# Altium footprint library Misc.PcbLib: 110 footprints (part 5 of 7)
Each footprint in its own frame and in the unit in brackets; x right, y up, seen from the top. Pads: shape width x height; smd on the part's side, far side on the other; paste and mask are expansions set on the pad; w line width, h text height; cw(c..) or ccw(c..) is an arc to the next point about the centre after c.
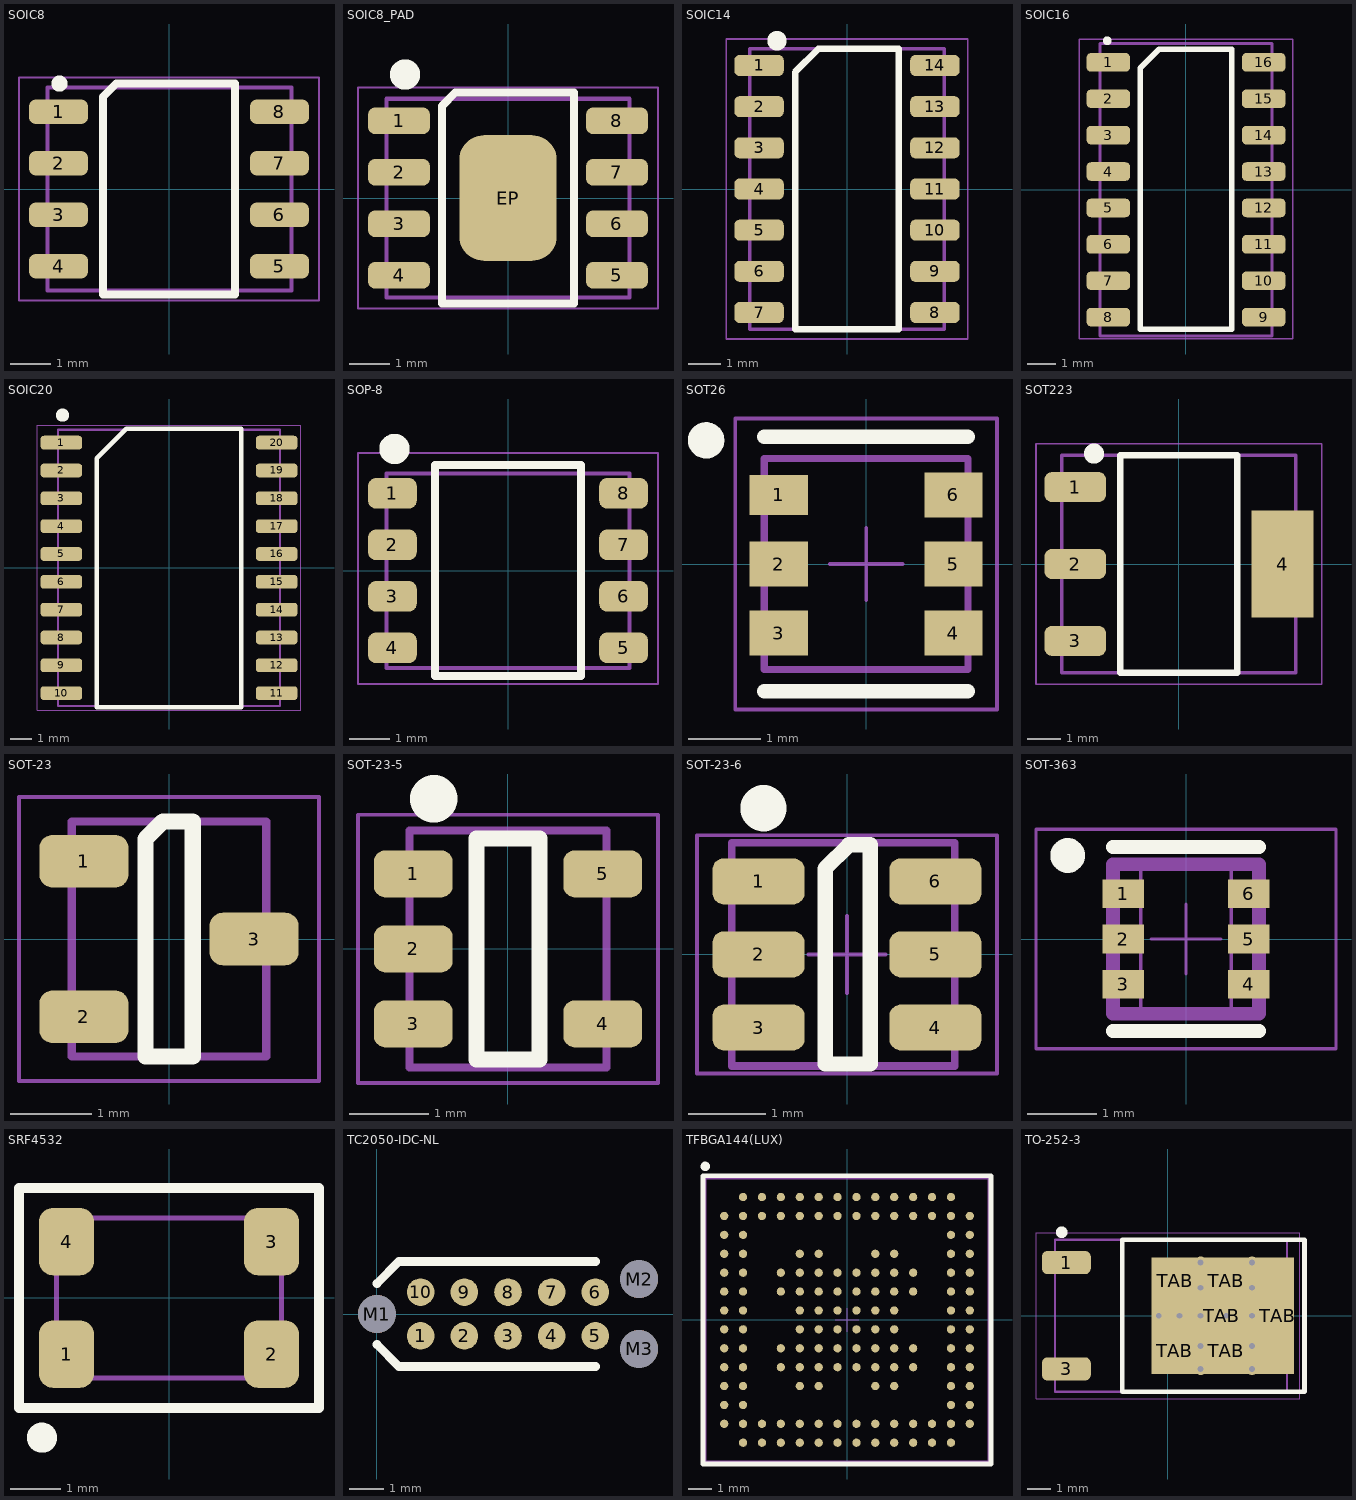
[diagram p4: the footprints below, top view; thin cyan lines are the x and y axes]

## SOIC8 [mm] "8-SOIC (0.154\", 3.90mm Width)"
height 1.75
pads (8):
  rrect50% 1.45x0.6 smd: 1(-2.725,1.905) 2(-2.725,0.635) 3(-2.725,-0.635) 4(-2.725,-1.905) 5(2.725,-1.905) 6(2.725,-0.635) 7(2.725,0.635) 8(2.725,1.905)
Top Overlay:
  circle w0.2: c-2.7,2.6 r0.1
  lines w0.2: -1.625,-2.6 1.625,-2.6 1.625,2.6 -1.3,2.6 -1.625,2.275 -1.625,-2.6
Mechanical 13:
  lines w0.1: -3,-2.5 -3,2.5 3.025,2.5 3.025,-2.5 -3,-2.5
Mechanical 15:
  lines w0.05: -3.7,-2.75 -3.7,2.75 3.7,2.75 3.7,-2.75 -3.7,-2.75
3D body "S08.stp": height 1.55, standoff 0, extent -2.975,-2.45 3.025,2.45

## SOIC8_PAD [mm] "8-SOIC with exposed pad (0.154\", 3.90mm Width)"
height 1.75
pads (9):
  rrect50% 1.525x0.65 smd: 1(-2.688,1.905) 2(-2.688,0.635) 3(-2.688,-0.635) 4(-2.688,-1.905) 5(2.688,-1.905) 6(2.688,-0.635) 7(2.688,0.635) 8(2.688,1.905)
  rrect50% 2.4x3.1 smd: EP(0,0)
Top Overlay:
  circle w0.5: c-2.54,3.048 r0.125
  lines w0.2: -1.625,-2.6 -1.625,2.275 -1.3,2.6 1.625,2.6 1.625,-2.6 -1.625,-2.6
Mechanical 13:
  lines w0.1: -3,-2.45 -3,2.45 3,2.45 3,-2.45 -3,-2.45
Mechanical 15:
  lines w0.05: -3.7,-2.725 -3.7,2.725 3.7,2.725 3.7,-2.725 -3.7,-2.725
3D body "AP64352QSP-13.stp": height 1.63, standoff 0, extent -3,-2.45 3,2.45

## SOIC14 [mm] "14 -SOIC (0.154\", 3.90mm Width)"
height 1.75
pads (14):
  rrect50% 1.525x0.65 smd: 1(-2.712,3.81) 2(-2.712,2.54) 3(-2.712,1.27) 4(-2.712,0) 5(-2.712,-1.27) 6(-2.712,-2.54) 7(-2.712,-3.81) 8(2.712,-3.81) 9(2.712,-2.54) 10(2.712,-1.27) 11(2.712,0) 12(2.712,1.27) 13(2.712,2.54) 14(2.712,3.81)
Top Overlay:
  circle w0.5: c-2.159,4.572 r0.05
  lines w0.2: -1.6,-4.325 1.6,-4.325 1.6,4.325 -0.508,4.325 -0.882,4.325 -1.6,3.607 -1.6,-4.325
Mechanical 13:
  lines w0.1: -3,-4.325 -3,4.325 3,4.325 3,-4.325 -3,-4.325
Mechanical 15:
  lines w0.05: -3.725,-4.625 -3.725,4.625 3.725,4.625 3.725,-4.625 -3.725,-4.625
3D body "LMV324ID.stp": height 1.75, standoff 0, extent -3,-4.325 3,4.325

## SOIC16 [mm] "16-SOIC (0.154\", 3.90mm Width)"
height 1.75
pads (16):
  rrect50% 1.525x0.65 smd: 1(-2.712,4.445) 2(-2.712,3.175) 3(-2.712,1.905) 4(-2.712,0.635) 5(-2.712,-0.635) 6(-2.712,-1.905) 7(-2.712,-3.175) 8(-2.712,-4.445) 9(2.712,-4.445) 10(2.712,-3.175) 11(2.712,-1.905) 12(2.712,-0.635) 13(2.712,0.635) 14(2.712,1.905) 15(2.712,3.175) 16(2.712,4.445)
Top Overlay:
  circle w0.2: c-2.75,5.2 r0.05
  lines w0.2: -1.6,-4.865 1.6,-4.865 1.6,4.9 -0.942,4.9 -1.6,4.242 -1.6,-4.865
Mechanical 13:
  lines w0.1: -3,-5.1 -3,5.1 3,5.1 3,-5.1 -3,-5.1
Mechanical 15:
  lines w0.05: -3.725,-5.2 -3.725,5.26 3.725,5.26 3.725,-5.2 -3.725,-5.2
3D body "User Library-so16.step": height 1.7, standoff 0, extent -3,-5.1 3,5.1

## SOIC20 [mm] "20-SOIC (0.295\", 7.50mm Width)"
height 2.65
pads (20):
  rrect50% 1.9x0.63 smd: 1(-4.91,5.715) 2(-4.91,4.445) 3(-4.91,3.175) 4(-4.91,1.905) 5(-4.91,0.635) 6(-4.91,-0.635) 7(-4.91,-1.905) 8(-4.91,-3.175) 9(-4.91,-4.445) 10(-4.91,-5.715) 11(4.91,-5.715) 12(4.91,-4.445) 13(4.91,-3.175) 14(4.91,-1.905) 15(4.91,-0.635) 16(4.91,0.635) 17(4.91,1.905) 18(4.91,3.175) 19(4.91,4.445) 20(4.91,5.715)
Top Overlay:
  circle w0.5: c-4.859,6.972 r0.05
  lines w0.2: -3.3,-6.35 3.3,-6.35 3.3,6.35 -1.95,6.35 -3.3,5 -3.3,-6.35
Mechanical 13:
  lines w0.1: -5.067,-6.3 -5.067,6.3 5.067,6.3 5.067,-6.3 -5.067,-6.3
Mechanical 15:
  lines w0.05: -6,-6.5 6,-6.5 6,6.5 -6,6.5 -6,-6.5
3D body "User Library-SOIC20.step": height 2.3, standoff 0.06, extent -5.067,-6.3 5.067,6.3

## SOP-8 [mm] "Surface Mount 8-SOP"
height 1.75
pads (8):
  rrect50% 1.2x0.75 smd: 1(-2.85,1.905) 2(-2.85,0.635) 3(-2.85,-0.635) 4(-2.85,-1.905) 5(2.85,-1.905) 6(2.85,-0.635) 7(2.85,0.635) 8(2.85,1.905)
Top Overlay:
  circle w0.5: c-2.8,3 r0.125
  lines w0.2: -1.8,-2.6 -1.8,2.6 1.8,2.6 1.8,-2.6 -1.8,-2.6
Mechanical 13:
  lines w0.1: -3,-2.4 -3,2.4 3,2.4 3,-2.4 -3,-2.4
Mechanical 15:
  lines w0.05: -3.7,-2.8 -3.7,2.9 3.7,2.9 3.7,-2.8 -3.7,-2.8
3D body "User Library-FairchildSemi 8-SOP.step": height 1.7, standoff 0, extent -2.997,-2.418 2.997,2.408

## SOT26 [mm] "SOT-26 - 6pin, 3x3.1mm"
height 1.1
pads (6):
  rect 0.8x0.55 smd paste+0 mask+0: 1(-1.2,0.95)
  rect 0.8x0.616 smd paste+0 mask+0: 2(-1.2,0) 3(-1.2,-0.95) 4(1.2,-0.95) 5(1.2,0) 6(1.2,0.95)
Top Overlay:
  circle w0.25: c-2.2,1.7 r0.125
  lines w0.2: -1.4,-1.75 1.4,-1.75 ; -1.4,1.75 1.4,1.75
Mechanical 13:
  lines w0.1: -1.4,-1.45 1.4,-1.45 1.4,1.45 -1.4,1.45 -1.4,-1.45
Mechanical 15:
  lines w0.05: -0.5,0 0.5,0 ; 0,-0.5 0,0.5 ; -1.8,-2 -1.8,2 1.8,2 1.8,-2 -1.8,-2
3D body "Diode_Diodes_Inc_D5V0P4UR6SO-7_eec.STEP": height 1.4, standoff 0, extent -1.4,-1.45 1.4,1.45

## SOT223 [mm] "Plastic surface-mounted package with increased heatsink; 4  leads"
height 1.8
pads (4):
  rrect50% 1.85x0.9 smd: 1(-3.1,2.3) 2(-3.1,0) 3(-3.1,-2.3)
  rect 1.85x3.2 smd: 4(3.1,0)
Top Overlay:
  circle w0.5: c-2.54,3.302 r0.05
  lines w0.2: -1.75,-3.25 1.75,-3.25 1.75,3.25 -1.75,3.25 -1.75,-3.25
Mechanical 13:
  lines w0.1: -3.5,-3.25 3.5,-3.25 3.5,3.25 -3.5,3.25 -3.5,-3.25
Mechanical 15:
  lines w0.05: -4.275,-3.6 4.275,-3.6 4.275,3.6 -4.275,3.6 -4.275,-3.6
3D body "AZ1117EH-3.3TRG1.stp": height 1.8, standoff 0, extent -3.5,-3.25 3.5,3.25

## SOT-23 [mm] "SOT23, 3-Leads, Body 2.92x1.3mm, Pitch 0.95mm"
height 1.3
pads (3):
  rrect50% 1.1x0.65 smd: 1(-1.05,0.96) 2(-1.05,-0.96) 3(1.05,0)
Top Overlay:
  lines w0.2: -0.29,-1.45 -0.29,1.234 -0.074,1.45 0.294,1.45 0.294,-1.45 -0.29,-1.45
Mechanical 13:
  lines w0.1: -1.2,-1.45 -1.2,1.45 1.2,1.45 1.2,-1.45 -1.2,-1.45
Mechanical 15:
  lines w0.05: -1.85,-1.75 -1.85,1.75 1.85,1.75 1.85,-1.75 -1.85,-1.75
3D body "TLV431AFTA.stp": height 1, standoff 0, extent -1.2,-1.45 1.2,1.45

## SOT-23-5 [mm] "5-Pin, Small Outline Transistor  Plastic Package (SOT23)"
height 1.45
pads (5):
  rrect50% 1x0.6 smd: 1(-1.2,0.95) 2(-1.2,0) 3(-1.2,-0.95) 4(1.2,-0.95) 5(1.2,0.95)
Top Overlay:
  circle w0.5: c-0.94,1.902 r0.05
  lines w0.2: -0.4,-1.4 0.4,-1.4 0.4,1.4 -0.4,1.4 -0.4,-1.4
Mechanical 13:
  lines w0.1: -1.25,-1.5 1.25,-1.5 1.25,1.5 -1.25,1.5 -1.25,-1.5
Mechanical 15:
  lines w0.05: -1.9,-1.7 1.9,-1.7 1.9,1.7 -1.9,1.7 -1.9,-1.7
3D body "CircuitWorks-SOT-23-5.step": height 1.05, standoff -0.05, extent -1.25,-1.5 1.25,1.5

## SOT-23-6 [mm] "SOT-23, 5-Leads, Body 2.8x1.5mm"
height 1.45
pads (6):
  rrect50% 1.2x0.6 smd: 1(-1.15,0.95) 2(-1.15,0) 3(-1.15,-0.95) 4(1.15,-0.95) 5(1.15,0) 6(1.15,0.95)
Top Overlay:
  circle w0.5: c-1.087,1.901 r0.05
  lines w0.2: -0.285,-1.425 -0.285,1.115 0.025,1.425 0.3,1.425 0.3,-1.425 -0.285,-1.425
Mechanical 13:
  lines w0.1: -1.5,-1.45 1.4,-1.45 1.4,1.45 -1.5,1.45 -1.5,-1.45
Mechanical 15:
  lines w0.05: -0.5,0 0.5,0 ; 0,-0.5 0,0.5 ; -1.95,-1.55 -1.95,1.55 1.95,1.55 1.95,-1.55 -1.95,-1.55
3D body "usblc6-2sc6y.stp": height 1.18, standoff 0, extent -1.45,-1.45 1.35,1.446

## SOT-363 [mm] "6 pin, 2x2.1mm"
height 0.9
pads (6):
  rect 0.6x0.412 smd: 1(-0.901,0.65) 2(-0.901,0) 3(-0.901,-0.65) 4(0.901,-0.65) 5(0.901,0) 6(0.901,0.65)
Top Overlay:
  circle w0.25: c-1.7,1.2 r0.125
  lines w0.2: -1.05,-1.325 1.05,-1.325 ; -1.05,1.325 1.05,1.325
Board:
  lines w0.05: -0.65,-1.075 -0.65,1.075 0.65,1.075 0.65,-1.075 -0.65,-1.075
Top Assembly:
  lines w0.2: -1.05,-1.075 -1.05,1.075 1.05,1.075 1.05,-1.075 -1.05,-1.075
Mechanical 15:
  lines w0.05: -0.5,0 0.5,0 ; 0,-0.5 0,0.5 ; -2.156,-1.575 -2.156,1.575 2.156,1.575 2.156,-1.575 -2.156,-1.575
3D body "Trans_Diodes_BSS8402DW-7-F_eec.STEP": height 1.1, standoff 0, extent -1.05,-1.075 1.05,1.075

## SRF4532 [mm] "0.177\" L x 0.126\" W (4.50mm x 3.20mm)"
height 3
pads (4):
  rrect50% 1.1x1.35 smd: 1(-2.05,-1.125) 2(2.05,-1.125) 3(2.05,1.125) 4(-2.05,1.125)
Top Overlay:
  circle w0.5: c-2.54,-2.798 r0.05
  lines w0.2: -3,-2.2 3,-2.2 3,2.2 -3,2.2 -3,-2.2
Mechanical 13:
  lines w0.1: -2.25,-1.6 2.25,-1.6 2.25,1.6 -2.25,1.6 -2.25,-1.6
Mechanical 15:
  lines w0.05: -3,-2.2 3,-2.2 3,2.2 -3,2.2 -3,-2.2
3D body "srf4532-220y.stp": height 2.8, standoff 0, extent -2.25,-1.6 2.25,1.6

## TC2050-IDC-NL [mm]
pads (13):
  round 0.8 smd paste-2539.97: 1(1.27,-0.635) 2(2.54,-0.635) 3(3.81,-0.635) 4(5.08,-0.635) 5(6.35,-0.635) 6(6.35,0.635) 7(5.08,0.635) 8(3.81,0.635) 9(2.54,0.635) 10(1.27,0.635)
  round 1.1 hole 1.1 unplated: M1(0,0) M2(7.62,1.016) M3(7.62,-1.016)
Top Overlay:
  lines w0.254: 0,-0.889 0.635,-1.524 6.35,-1.524 ; 0,0.889 0.635,1.524 6.35,1.524

## TFBGA144(LUX) [mm] "144-Ball Thin Fine-Pitch Ball Grid Array Package (LUX) - 12×12×1.19 mm Body [TFBGA]"
height 1.19
pads (144):
  round 0.35 smd: A2(-4.4,5.2) A3(-3.6,5.2) A4(-2.8,5.2) A5(-2,5.2) A6(-1.2,5.2) A7(-0.4,5.2) A8(0.4,5.2) A9(1.2,5.2) A10(2,5.2) A11(2.8,5.2) A12(3.6,5.2) A13(4.4,5.2) B1(-5.2,4.4) B2(-4.4,4.4) B3(-3.6,4.4) B4(-2.8,4.4) B5(-2,4.4) B6(-1.2,4.4) B7(-0.4,4.4) B8(0.4,4.4) B9(1.2,4.4) B10(2,4.4) B11(2.8,4.4) B12(3.6,4.4) B13(4.4,4.4) B14(5.2,4.4) C1(-5.2,3.6) C2(-4.4,3.6) C13(4.4,3.6) C14(5.2,3.6) D1(-5.2,2.8) D2(-4.4,2.8) D5(-2,2.8) D6(-1.2,2.8) D9(1.2,2.8) D10(2,2.8) D13(4.4,2.8) D14(5.2,2.8) E1(-5.2,2) E2(-4.4,2) E4(-2.8,2) E5(-2,2) E6(-1.2,2) E7(-0.4,2) E8(0.4,2) E9(1.2,2) E10(2,2) E11(2.8,2) E13(4.4,2) E14(5.2,2) F1(-5.2,1.2) F2(-4.4,1.2) F4(-2.8,1.2) F5(-2,1.2) F6(-1.2,1.2) F7(-0.4,1.2) F8(0.4,1.2) F9(1.2,1.2) F10(2,1.2) F11(2.8,1.2) F13(4.4,1.2) F14(5.2,1.2) G1(-5.2,0.4) G2(-4.4,0.4) G5(-2,0.4) G6(-1.2,0.4) G7(-0.4,0.4) G8(0.4,0.4) G9(1.2,0.4) G10(2,0.4) G13(4.4,0.4) G14(5.2,0.4) H1(-5.2,-0.4) H2(-4.4,-0.4) H5(-2,-0.4) H6(-1.2,-0.4) H7(-0.4,-0.4) H8(0.4,-0.4) H9(1.2,-0.4) H10(2,-0.4) H13(4.4,-0.4) H14(5.2,-0.4) J1(-5.2,-1.2) J2(-4.4,-1.2) J4(-2.8,-1.2) J5(-2,-1.2) J6(-1.2,-1.2) J7(-0.4,-1.2) J8(0.4,-1.2) J9(1.2,-1.2) J10(2,-1.2) J11(2.8,-1.2) J13(4.4,-1.2) J14(5.2,-1.2) K1(-5.2,-2) K2(-4.4,-2) K4(-2.8,-2) K5(-2,-2) K6(-1.2,-2) K7(-0.4,-2) K8(0.4,-2) K9(1.2,-2) K10(2,-2) K11(2.8,-2) K13(4.4,-2) K14(5.2,-2) L1(-5.2,-2.8) L2(-4.4,-2.8) L5(-2,-2.8) L6(-1.2,-2.8) L9(1.2,-2.8) L10(2,-2.8) L13(4.4,-2.8) L14(5.2,-2.8) M1(-5.2,-3.6) M2(-4.4,-3.6) M13(4.4,-3.6) M14(5.2,-3.6) N1(-5.2,-4.4) N2(-4.4,-4.4) N3(-3.6,-4.4) N4(-2.8,-4.4) N5(-2,-4.4) N6(-1.2,-4.4) N7(-0.4,-4.4) N8(0.4,-4.4) N9(1.2,-4.4) N10(2,-4.4) N11(2.8,-4.4) N12(3.6,-4.4) N13(4.4,-4.4) N14(5.2,-4.4) P2(-4.4,-5.2) P3(-3.6,-5.2) P4(-2.8,-5.2) P5(-2,-5.2) P6(-1.2,-5.2) P7(-0.4,-5.2) P8(0.4,-5.2) P9(1.2,-5.2) P10(2,-5.2) P11(2.8,-5.2) P12(3.6,-5.2) P13(4.4,-5.2)
Top Overlay:
  circle w0.2: c-6,6.5 r0.1
  lines w0.2: -6.1,-6.1 6.1,-6.1 6.1,6.1 -6.1,6.1 -6.1,-6.1
Mechanical 13:
  lines w0.1: -6,-6 6,-6 6,6 -6,6 -6,-6
Mechanical 15:
  lines w0.05: -0.5,0 0.5,0 ; 0,-0.5 0,0.5 ; -6,-6 6,-6 6,6 -6,6 -6,-6
3D body: height 1.19, standoff 0, extent -6,-6 6,6

## TO-252-3 [mm] "TO-252-3, DPak (2 Leads + Tab), SC-63"
height 2.28
pads (8):
  rrect50% 2.1x1 smd: 1(-4.35,2.28) 3(-4.35,-2.28)
  rect 1.4x2 smd paste-2539.97 mask+0.102: TAB(0.3,-1.5) TAB(0.311,1.501) TAB(2.5,-1.5) TAB(2.5,1.5)
  rect 6x5 smd paste-10 mask+0.102: TAB(2.3,0)
  rect 1.4x5 smd paste-2539.97 mask+0.102: TAB(4.7,0)
via 1.4,0 diameter 0.5 hole 0.25
via 1.4,2.28 diameter 0.5 hole 0.25
via 1.4,-2.28 diameter 0.5 hole 0.25
via 2.5,0 diameter 0.5 hole 0.25
via 3.6,0 diameter 0.5 hole 0.25
via 3.6,2.28 diameter 0.5 hole 0.25
via 3.6,-2.28 diameter 0.5 hole 0.25
via 3.6,-1.3 diameter 0.5 hole 0.25
via 1.4,-1.3 diameter 0.5 hole 0.25
via 1.4,1.2 diameter 0.5 hole 0.25
via 3.6,1.2 diameter 0.5 hole 0.25
via 0.5,0 diameter 0.5 hole 0.25
via -0.389,0 diameter 0.5 hole 0.25
Top Overlay:
  circle w0.25: c-4.55,3.575 r0.125
  lines w0.2: -1.95,-3.25 -1.95,3.25 5.85,3.25 5.85,-3.25 -1.95,-3.25
Top Paste:
  rectangle: -0.614,0.3 1.011,2.416
  rectangle: 1.678,0.3 3.302,2.416
  rectangle: -0.614,-2.416 1.011,-0.3
  rectangle: 1.678,-2.416 3.302,-0.3
  rectangle: 3.9,-2.4 5.3,2.4
Mechanical 13:
  lines w0.1: -4.836,-3.25 -4.836,3.25 5.1,3.25 5.1,-3.25 -4.836,-3.25
Mechanical 15:
  lines w0.05: -5.65,-3.55 -5.65,3.55 5.65,3.55 5.65,-3.55 -5.65,-3.55
3D body "User Library-DPAK-1.step": height 2.34, standoff -0.07, extent -4.836,-3.27 5.102,3.27